# Altium footprint library Tomra_Cadstar_Footprints.PcbLib: 373 footprints (part 12 of 24)
Each footprint in its own frame and in the unit in brackets; x right, y up, seen from the top. Pads: shape width x height; smd on the part's side, far side on the other; paste and mask are expansions set on the pad; w line width, h text height; cw(c..) or ccw(c..) is an arc to the next point about the centre after c.
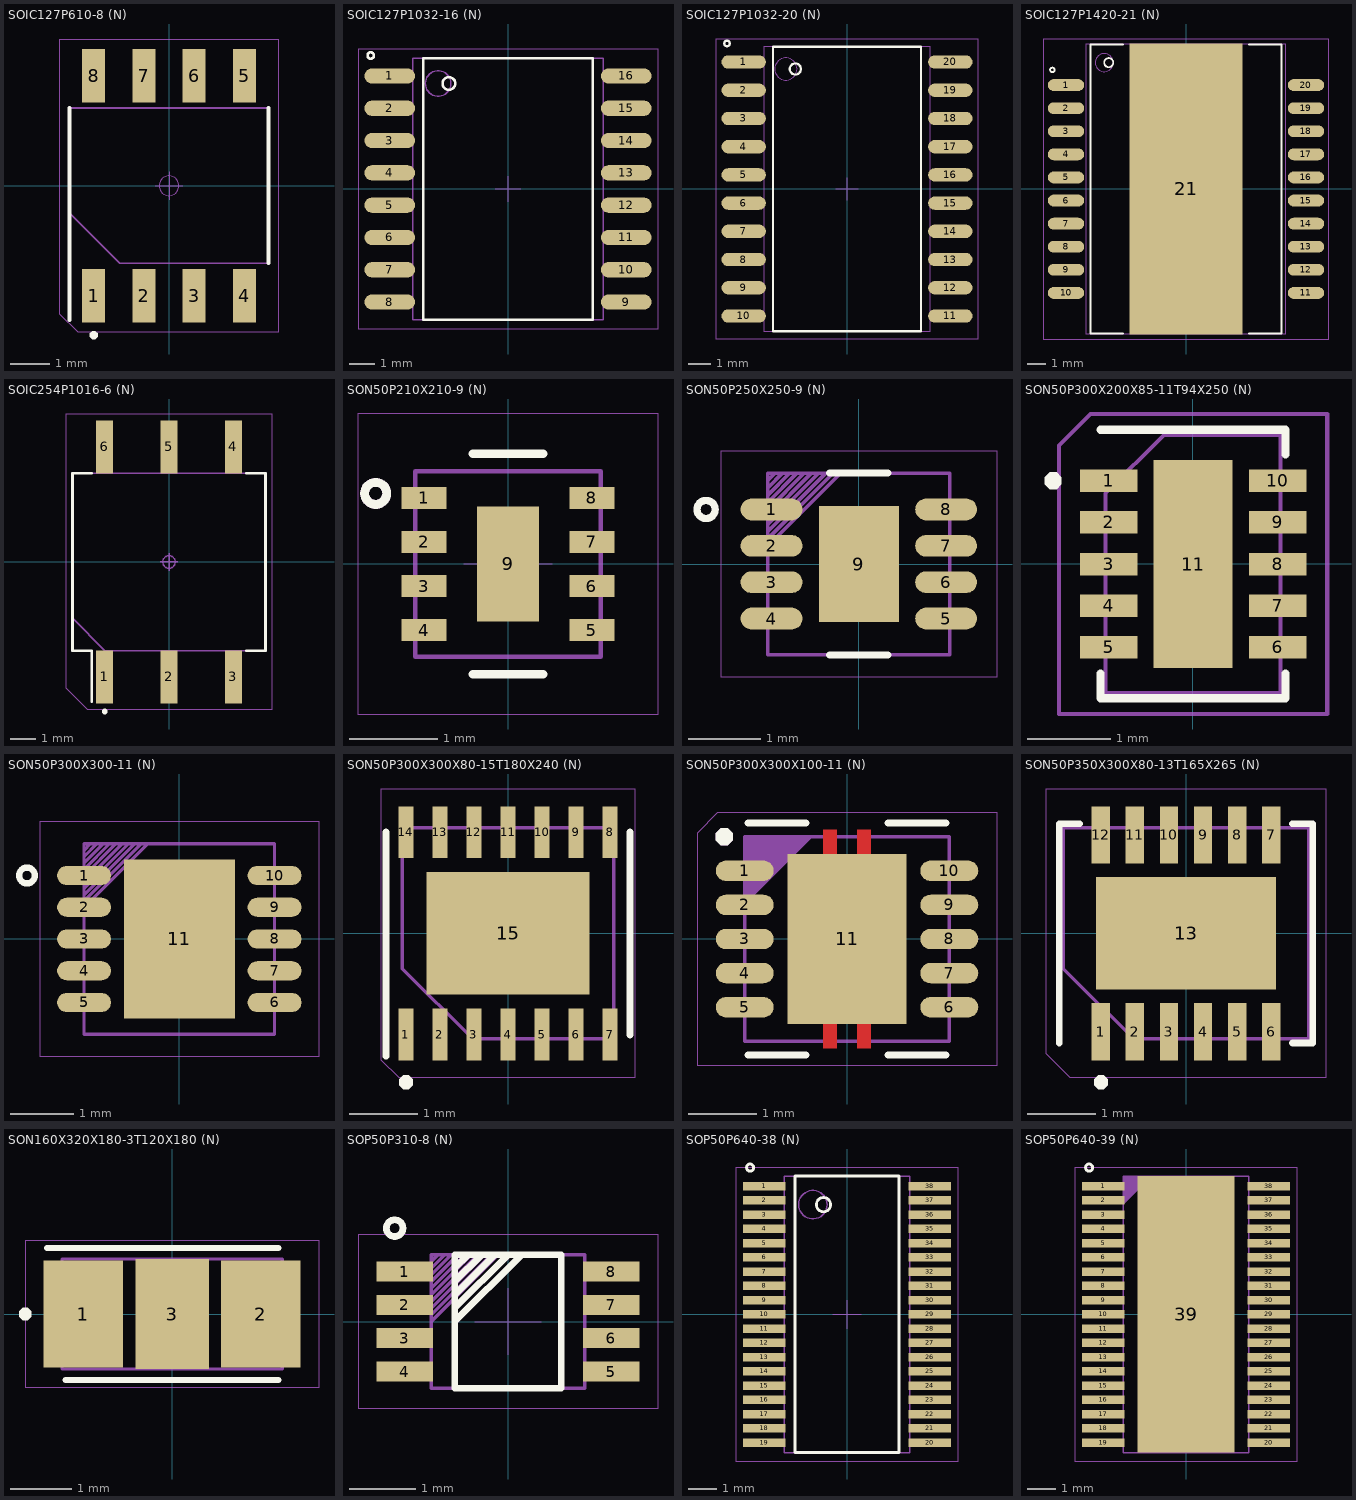
[diagram p11: the footprints below, top view; thin cyan lines are the x and y axes]

## SOIC127P610-8 (N) [mm]
height 3.51
pads (8):
  rect 0.58x1.35 smd paste+0 mask+0: 1(-1.905,-2.78) 2(-0.635,-2.78) 3(0.635,-2.78) 4(1.905,-2.78) 5(1.905,2.78) 6(0.635,2.78) 7(-0.635,2.78) 8(-1.905,2.78)
Top Silk:
  region: -2.005,-3.775 -2.005,-3.734 -1.946,-3.675 -1.864,-3.675 -1.805,-3.734 -1.805,-3.775 -1.805,-3.816 -1.864,-3.875 -1.946,-3.875 -2.005,-3.816
  lines w0.1: -2.51,-3.395 -2.51,1.96 ; 2.51,-1.96 2.51,1.96
  text ".Designator" at -3.599,-0.35 h0.7
Top Assembly:
  lines w0.05: -2.51,-0.69 -1.24,-1.96 2.51,-1.96 2.51,1.96 -2.51,1.96 -2.51,-0.69
Top Placement:
  lines w0.01: -0.35,0 0.35,0 ; 0,-0.35 0,0.35 ; -2.76,-3.25 -2.3,-3.71 2.76,-3.71 2.76,3.71 -2.76,3.71 -2.76,-3.25 ; -0.25,0 cw(c0,0) 0.25,0 cw(c0,0) -0.25,0

## SOIC127P1032-16 (N) [mm]
height 2.65
pads (16):
  oval 2x0.6 smd paste+0 mask+0: 1(-4.65,4.445) 2(-4.65,3.175) 3(-4.65,1.905) 4(-4.65,0.635) 5(-4.65,-0.635) 6(-4.65,-1.905) 7(-4.65,-3.175) 8(-4.65,-4.445) 9(4.65,-4.445) 10(4.65,-3.175) 11(4.65,-1.905) 12(4.65,-0.635) 13(4.65,0.635) 14(4.65,1.905) 15(4.65,3.175) 16(4.65,4.445)
Top Silk:
  lines w0.1: -5.525,5.25 cw(c-5.4,5.25) -5.275,5.25 cw(c-5.4,5.25) -5.525,5.25 ; -3.325,-5.15 3.325,-5.15 3.325,5.15 -3.325,5.15 -3.325,-5.15 ; -2.575,4.15 cw(c-2.325,4.15) -2.075,4.15 cw(c-2.325,4.15) -2.575,4.15
  text ".Designator" at -3.599,-0.35 h0.7
Top Assembly:
  lines w0.05: -3.75,-5.15 3.75,-5.15 3.75,5.15 -3.75,5.15 -3.75,-5.15 ; -3.25,4.15 cw(c-2.75,4.15) -2.25,4.15 cw(c-2.75,4.15) -3.25,4.15
Top Placement:
  lines w0.01: -0.5,0 0.5,0 ; 0,-0.5 0,0.5 ; -5.9,-5.5 5.9,-5.5 5.9,5.5 -5.9,5.5 -5.9,-5.5

## SOIC127P1032-20 (N) [mm]
height 2.65
pads (20):
  oval 2x0.6 smd paste+0 mask+0: 1(-4.65,5.715) 2(-4.65,4.445) 3(-4.65,3.175) 4(-4.65,1.905) 5(-4.65,0.635) 6(-4.65,-0.635) 7(-4.65,-1.905) 8(-4.65,-3.175) 9(-4.65,-4.445) 10(-4.65,-5.715) 11(4.65,-5.715) 12(4.65,-4.445) 13(4.65,-3.175) 14(4.65,-1.905) 15(4.65,-0.635) 16(4.65,0.635) 17(4.65,1.905) 18(4.65,3.175) 19(4.65,4.445) 20(4.65,5.715)
Top Silk:
  lines w0.1: -5.525,6.55 cw(c-5.4,6.55) -5.275,6.55 cw(c-5.4,6.55) -5.525,6.55 ; -3.325,-6.4 3.325,-6.4 3.325,6.4 -3.325,6.4 -3.325,-6.4 ; -2.575,5.4 cw(c-2.325,5.4) -2.075,5.4 cw(c-2.325,5.4) -2.575,5.4
  text ".Designator" at -3.599,-0.35 h0.7
Top Assembly:
  lines w0.05: -3.75,-6.4 3.75,-6.4 3.75,6.4 -3.75,6.4 -3.75,-6.4 ; -3.25,5.4 cw(c-2.75,5.4) -2.25,5.4 cw(c-2.75,5.4) -3.25,5.4
Top Placement:
  lines w0.01: -0.5,0 0.5,0 ; 0,-0.5 0,0.5 ; -5.9,-6.75 5.9,-6.75 5.9,6.75 -5.9,6.75 -5.9,-6.75

## SOIC127P1420-21 (N) [mm]
height 3.6
pads (21):
  oval 2x0.65 smd paste+0 mask+0: 1(-6.6,5.715) 2(-6.6,4.445) 3(-6.6,3.175) 4(-6.6,1.905) 5(-6.6,0.635) 6(-6.6,-0.635) 7(-6.6,-1.905) 8(-6.6,-3.175) 9(-6.6,-4.445) 10(-6.6,-5.715) 11(6.6,-5.715) 12(6.6,-4.445) 13(6.6,-3.175) 14(6.6,-1.905) 15(6.6,-0.635) 16(6.6,0.635) 17(6.6,1.905) 18(6.6,3.175) 19(6.6,4.445) 20(6.6,5.715)
  rect 6.2x16 smd paste+0 mask+0: 21(0,0)
Top Silk:
  lines w0.1: -3.45,-7.95 -5.25,-7.95 -5.25,7.95 -3.45,7.95 ; 3.45,-7.95 5.25,-7.95 5.25,7.95 3.45,7.95 ; -7.475,6.55 cw(c-7.35,6.55) -7.225,6.55 cw(c-7.35,6.55) -7.475,6.55 ; -4.5,6.95 cw(c-4.25,6.95) -4,6.95 cw(c-4.25,6.95) -4.5,6.95
  text ".Designator" at -3.599,-0.35 h0.7
Top Assembly:
  lines w0.05: -5.5,-7.95 5.5,-7.95 5.5,7.95 -5.5,7.95 -5.5,-7.95 ; -5,6.95 cw(c-4.5,6.95) -4,6.95 cw(c-4.5,6.95) -5,6.95
Top Placement:
  lines w0.01: -0.5,0 0.5,0 ; 0,-0.5 0,0.5 ; -7.85,-8.25 7.85,-8.25 7.85,8.25 -7.85,8.25 -7.85,-8.25

## SOIC254P1016-6 (N) [mm]
height 4.6
pads (6):
  rect 0.67x2.09 smd paste+0 mask+0: 1(-2.54,-4.54) 2(0,-4.54) 3(2.54,-4.54) 4(2.54,4.54) 5(0,4.54) 6(-2.54,4.54)
Top Silk:
  region: -2.64,-5.905 -2.64,-5.864 -2.581,-5.805 -2.499,-5.805 -2.44,-5.864 -2.44,-5.905 -2.44,-5.946 -2.499,-6.005 -2.581,-6.005 -2.64,-5.946
  lines w0.1: -3.055,-5.525 -3.055,-3.5 -3.81,-3.5 -3.81,3.5 -3.055,3.5 ; 3.055,-3.5 3.81,-3.5 3.81,3.5 3.055,3.5
  text ".Designator" at -3.599,-0.35 h0.7
Top Assembly:
  lines w0.05: -3.81,-2.23 -2.54,-3.5 3.81,-3.5 3.81,3.5 -3.81,3.5 -3.81,-2.23
Top Placement:
  lines w0.01: -4.06,-4.98 -3.2,-5.84 4.06,-5.84 4.06,5.84 -4.06,5.84 -4.06,-4.98
  lines w0.05: -0.35,0 0.35,0 ; 0,-0.35 0,0.35 ; -0.25,0 cw(c0,0) 0.25,0 cw(c0,0) -0.25,0

## SON50P210X210-9 (N) [mm]
height 0.8
pads (9):
  rect 0.51x0.25 smd paste+0 mask+0: 1(-0.95,0.75) 2(-0.95,0.25) 3(-0.95,-0.25) 4(-0.95,-0.75) 5(0.95,-0.75) 6(0.95,-0.25) 7(0.95,0.25) 8(0.95,0.75)
  rect 0.7x1.3 smd paste+0 mask+0: 9(0,0)
Top Silk:
  lines w0.1: -0.4,-1.25 0.4,-1.25 ; -0.4,1.25 0.4,1.25 ; -1.625,0.8 cw(c-1.5,0.8) -1.375,0.8 cw(c-1.5,0.8) -1.625,0.8
  text ".Designator" at -3.599,-0.35 h0.7
Top Assembly:
  lines w0.05: -1.05,-1.05 -1.05,1.05 1.05,1.05 1.05,-1.05 -1.05,-1.05
  lines w0.1: -1.625,0.8 cw(c-1.5,0.8) -1.375,0.8 cw(c-1.5,0.8) -1.625,0.8
Top Placement:
  lines w0.01: -0.5,0 0.5,0 ; 0,-0.5 0,0.5 ; -1.7,-1.7 1.7,-1.7 1.7,1.7 -1.7,1.7 -1.7,-1.7

## SON50P250X250-9 (N) [mm]
height 0.8
pads (9):
  oval 0.85x0.3 smd paste+0 mask+0: 1(-1.2,0.75) 2(-1.2,0.25) 3(-1.2,-0.25) 4(-1.2,-0.75) 5(1.2,-0.75) 6(1.2,-0.25) 7(1.2,0.25) 8(1.2,0.75)
  rect 1.1x1.6 smd paste+0 mask+0: 9(0,0)
Top Silk:
  lines w0.1: -0.4,-1.25 0.4,-1.25 ; -0.4,1.25 0.4,1.25 ; -2.225,0.75 cw(c-2.1,0.75) -1.975,0.75 cw(c-2.1,0.75) -2.225,0.75
  text ".Designator" at -3.599,-0.35 h0.7
Top Assembly:
  lines w0.05: -1.25,0.25 -0.25,1.25 ; -1.25,0.35 -0.35,1.25 ; -1.25,0.45 -0.45,1.25 ; -1.25,0.55 -0.55,1.25 ; -1.25,0.65 -0.65,1.25 ; -1.25,0.75 -0.75,1.25 ; -1.25,0.85 -0.85,1.25 ; -1.25,0.95 -0.95,1.25 ; -1.25,1.05 -1.05,1.25 ; -1.25,1.15 -1.15,1.25 ; -1.25,-1.25 -1.25,1.25 1.25,1.25 1.25,-1.25 -1.25,-1.25
Top Placement:
  lines w0.01: -0.5,0 0.5,0 ; 0,-0.5 0,0.5 ; -1.9,-1.55 1.9,-1.55 1.9,1.55 -1.9,1.55 -1.9,-1.55

## SON50P300X200X85-11T94X250 (N) [mm]
height 0.85
pads (11):
  rect 0.69x0.27 smd paste+0 mask+0: 1(-1.012,0.997) 2(-1.012,0.497) 3(-1.012,-0.003) 4(-1.012,-0.503) 5(-1.012,-1.002) 6(1.017,-1.002) 7(1.017,-0.503) 8(1.017,-0.003) 9(1.017,0.497) 10(1.017,0.997)
  rect 0.95x2.5 smd paste+0 mask+0: 11(0.002,-0.003)
Top Silk:
  region: -1.677,1.097 -1.636,1.097 -1.578,1.039 -1.578,0.956 -1.636,0.897 -1.677,0.897 -1.719,0.897 -1.777,0.956 -1.777,1.039 -1.719,1.097
  lines w0.1: -1.108,-1.318 -1.108,-1.613 1.112,-1.613 1.112,-1.318 ; -1.108,1.607 1.112,1.607 1.112,1.312
  text ".Designator" at -1.108,1.607 h0.7
Top Assembly:
  lines w0.05: -1.048,-1.553 -1.048,0.847 -0.347,1.548 1.052,1.548 1.052,-1.553 -1.048,-1.553
Top Placement:
  lines w0.05: -0.347,-0.003 0.352,-0.003 ; 0.002,-0.353 0.002,0.347 ; -1.607,-1.803 1.612,-1.803 1.612,1.797 -1.23,1.797 -1.607,1.42 -1.607,-1.803 ; 0.002,-0.253 ccw(c0.002,-0.003) 0.002,0.247 ccw(c0.002,-0.003) 0.002,-0.253

## SON50P300X300-11 (N) [mm]
height 1
pads (11):
  oval 0.85x0.3 smd paste+0 mask+0: 1(-1.5,1) 2(-1.5,0.5) 3(-1.5,0) 4(-1.5,-0.5) 5(-1.5,-1) 6(1.5,-1) 7(1.5,-0.5) 8(1.5,0) 9(1.5,0.5) 10(1.5,1)
  rect 1.75x2.5 smd paste+0 mask+0: 11(0,0)
Top Silk:
  lines w0.1: -2.525,1 cw(c-2.4,1) -2.275,1 cw(c-2.4,1) -2.525,1
  text ".Designator" at -3.599,-0.35 h0.7
Top Assembly:
  lines w0.05: -1.5,0.5 -0.5,1.5 ; -1.5,0.6 -0.6,1.5 ; -1.5,0.7 -0.7,1.5 ; -1.5,0.8 -0.8,1.5 ; -1.5,0.9 -0.9,1.5 ; -1.5,1 -1,1.5 ; -1.5,1.1 -1.1,1.5 ; -1.5,1.2 -1.2,1.5 ; -1.5,1.3 -1.3,1.5 ; -1.5,1.4 -1.4,1.5 ; -1.5,-1.5 -1.5,1.5 1.5,1.5 1.5,-1.5 -1.5,-1.5
Top Placement:
  lines w0.01: -0.5,0 0.5,0 ; 0,-0.5 0,0.5 ; -2.2,-1.85 2.2,-1.85 2.2,1.85 -2.2,1.85 -2.2,-1.85

## SON50P300X300X80-15T180X240 (N) [mm]
height 0.8
pads (15):
  rect 0.22x0.76 smd paste+0 mask+0: 1(-1.5,-1.485) 2(-1,-1.485) 3(-0.5,-1.485) 4(0,-1.485) 5(0.5,-1.485) 6(1,-1.485) 7(1.5,-1.485) 8(1.5,1.485) 9(1,1.485) 10(0.5,1.485) 11(0,1.485) 12(-0.5,1.485) 13(-1,1.485) 14(-1.5,1.485)
  rect 2.4x1.8 smd paste+0 mask+0: 15(0,0)
Top Silk:
  region: -1.6,-2.185 -1.6,-2.144 -1.541,-2.085 -1.459,-2.085 -1.4,-2.144 -1.4,-2.185 -1.4,-2.226 -1.459,-2.285 -1.541,-2.285 -1.6,-2.226
  lines w0.1: -1.79,-1.805 -1.79,1.49 ; 1.79,-1.49 1.79,1.49
  text ".Designator" at -1.86,2.12 h0.7
Top Assembly:
  lines w0.05: -1.55,-0.517 -0.517,-1.55 1.55,-1.55 1.55,1.55 -1.55,1.55 -1.55,-0.517
Top Placement:
  lines w0.01: -1.86,-1.86 -1.6,-2.12 1.86,-2.12 1.86,2.12 -1.86,2.12 -1.86,-1.86
  lines w0.05: -0.35,0 0.35,0 ; 0,-0.35 0,0.35 ; -0.25,0 cw(c0,0) 0.25,0 cw(c0,0) -0.25,0

## SON50P300X300X100-11 (N) [mm]
height 1
pads (11):
  oval 0.85x0.3 smd paste+0 mask+0: 1(-1.5,1) 2(-1.5,0.5) 3(-1.5,0) 4(-1.5,-0.5) 5(-1.5,-1) 6(1.5,-1) 7(1.5,-0.5) 8(1.5,0) 9(1.5,0.5) 10(1.5,1)
  rect 1.75x2.5 smd paste-0.75 mask+0: 11(0,0)
Top Elec:
  region: -0.8,-1.15 -0.35,-1.15 -0.35,-1.6 -0.15,-1.6 -0.15,-1.15 0.15,-1.15 0.15,-1.6 0.35,-1.6 0.35,-1.15 0.8,-1.15 0.8,1.15 0.35,1.15 0.35,1.6 0.15,1.6 0.15,1.15 -0.15,1.15 -0.15,1.6 -0.35,1.6 -0.35,1.15 -0.8,1.15
Top Silk:
  region: -1.925,1.5 -1.925,1.552 -1.852,1.625 -1.748,1.625 -1.675,1.552 -1.675,1.5 -1.675,1.448 -1.748,1.375 -1.852,1.375 -1.925,1.448
  lines w0.1: -1.45,-1.7 -0.6,-1.7 ; -1.45,1.7 -0.6,1.7 ; 0.6,-1.7 1.45,-1.7 ; 0.6,1.7 1.45,1.7
  text ".Designator" at -3.599,-0.35 h0.7
Top Solder Resist:
  region: -0.8,-1.15 -0.35,-1.15 -0.35,-1.6 -0.15,-1.6 -0.15,-1.15 0.15,-1.15 0.15,-1.6 0.35,-1.6 0.35,-1.15 0.8,-1.15 0.8,1.15 0.35,1.15 0.35,1.6 0.15,1.6 0.15,1.15 -0.15,1.15 -0.15,1.6 -0.35,1.6 -0.35,1.15 -0.8,1.15
Top Assembly:
  region: -1.5,1.5 -0.5,1.5 -1.5,0.5
  region: -1.925,1.5 -1.925,1.552 -1.852,1.625 -1.748,1.625 -1.675,1.552 -1.675,1.5 -1.675,1.448 -1.748,1.375 -1.852,1.375 -1.925,1.448
  lines w0.05: -1.5,-1.5 -1.5,1.5 1.5,1.5 1.5,-1.5 -1.5,-1.5
Top Placement:
  lines w0.01: -0.5,0 0.5,0 ; 0,-0.5 0,0.5 ; -2.2,-1.85 2.2,-1.85 2.2,1.85 -1.9,1.85 -2.2,1.55 -2.2,-1.85

## SON50P350X300X80-13T165X265 (N) [mm]
height 0.8
pads (13):
  rect 0.27x0.84 smd paste+0 mask+0: 1(-1.25,-1.445) 2(-0.75,-1.445) 3(-0.25,-1.445) 4(0.25,-1.445) 5(0.75,-1.445) 6(1.25,-1.445) 7(1.25,1.445) 8(0.75,1.445) 9(0.25,1.445) 10(-0.25,1.445) 11(-0.75,1.445) 12(-1.25,1.445)
  rect 2.65x1.65 smd paste+0 mask+0: 13(0,0)
Top Silk:
  region: -1.35,-2.185 -1.35,-2.144 -1.291,-2.085 -1.209,-2.085 -1.15,-2.144 -1.15,-2.185 -1.15,-2.226 -1.209,-2.285 -1.291,-2.285 -1.35,-2.226
  lines w0.1: -1.86,-1.61 -1.86,1.61 -1.565,1.61 ; 1.565,-1.61 1.86,-1.61 1.86,1.61 1.565,1.61
  text ".Designator" at -2.05,2.12 h0.7
Top Paste:
  region: 1.13,-0.63 0.1,-0.63 0.1,-0.1 1.13,-0.1
  region: 1.13,0.1 0.1,0.1 0.1,0.63 1.13,0.63
  region: -0.1,-0.63 -1.13,-0.63 -1.13,-0.1 -0.1,-0.1
  region: -0.1,0.1 -1.13,0.1 -1.13,0.63 -0.1,0.63
Top Assembly:
  lines w0.05: -1.8,-0.517 -0.767,-1.55 1.8,-1.55 1.8,1.55 -1.8,1.55 -1.8,-0.517
Top Placement:
  lines w0.01: -2.05,-1.77 -1.7,-2.12 2.05,-2.12 2.05,2.12 -2.05,2.12 -2.05,-1.77
  lines w0.05: -0.35,0 0.35,0 ; 0,-0.35 0,0.35 ; -0.25,0 cw(c0,0) 0.25,0 cw(c0,0) -0.25,0

## SON160X320X180-3T120X180 (N) [mm]
height 1.8
pads (3):
  rrect0% 1.3x1.74 smd paste+0 mask+0: 1(-1.45,0) 2(1.45,0)
  rect 1.2x1.8 smd paste+0 mask+0: 3(0,0)
Top Silk:
  region: -2.4,0.1 -2.359,0.1 -2.3,0.041 -2.3,-0.041 -2.359,-0.1 -2.4,-0.1 -2.441,-0.1 -2.5,-0.041 -2.5,0.041 -2.441,0.1
  lines w0.1: -2.04,1.08 1.74,1.08 ; -1.74,-1.08 1.74,-1.08
  text ".Designator" at -3.599,-0.35 h0.7
Top Paste:
  region: -0.39,-0.76 -0.39,-0.07 0.39,-0.07 0.39,-0.76
  region: -0.39,0.07 -0.39,0.76 0.39,0.76 0.39,0.07
Top Assembly:
  lines w0.05: -1.8,-0.9 -1.8,0.9 1.8,0.9 1.8,-0.9 -1.8,-0.9
Top Placement:
  lines w0.01: -2.4,-1.2 -2.4,1.2 2.4,1.2 2.4,-1.2 -2.4,-1.2
  lines w0.05: 0,-0.25 ccw(c0,0) 0,0.25 ; 0,-0.25 cw(c0,0) 0,0.25 ; 0,-0.25 ccw(c0,0) 0,0.25 ; 0,-0.25 cw(c0,0) 0,0.25 ; -0.35,0 0.35,0 -0.35,0 ; 0,-0.35 0,0.35 0,-0.35

## SOP50P310-8 (N) [mm]
height 0.9
pads (8):
  rect 0.85x0.3 smd paste+0 mask+0: 1(-1.55,0.75) 2(-1.55,0.25) 3(-1.55,-0.25) 4(-1.55,-0.75) 5(1.55,-0.75) 6(1.55,-0.25) 7(1.55,0.25) 8(1.55,0.75)
Top Silk:
  lines w0.1: -0.8,0 0.2,1 ; -0.8,0.2 0,1 ; -0.8,0.4 -0.2,1 ; -0.8,0.6 -0.4,1 ; -0.8,0.8 -0.6,1 ; -1.825,1.4 cw(c-1.7,1.4) -1.575,1.4 cw(c-1.7,1.4) -1.825,1.4 ; -0.8,-1 0.8,-1 0.8,1 -0.8,1 -0.8,-1
  text ".Designator" at -3.599,-0.35 h0.7
Top Assembly:
  lines w0.05: -1.15,0 -0.15,1 ; -1.15,0.1 -0.25,1 ; -1.15,0.2 -0.35,1 ; -1.15,0.3 -0.45,1 ; -1.15,0.4 -0.55,1 ; -1.15,0.5 -0.65,1 ; -1.15,0.6 -0.75,1 ; -1.15,0.7 -0.85,1 ; -1.15,0.8 -0.95,1 ; -1.15,0.9 -1.05,1 ; -1.15,-1 1.15,-1 1.15,1 -1.15,1 -1.15,-1
Top Placement:
  lines w0.01: -0.5,0 0.5,0 ; 0,-0.5 0,0.5 ; -2.25,-1.3 2.25,-1.3 2.25,1.3 -2.25,1.3 -2.25,-1.3

## SOP50P640-38 (N) [mm]
height 1.2
pads (38):
  rect 1.5x0.3 smd paste+0 mask+0: 1(-2.9,4.5) 2(-2.9,4) 3(-2.9,3.5) 4(-2.9,3) 5(-2.9,2.5) 6(-2.9,2) 7(-2.9,1.5) 8(-2.9,1) 9(-2.9,0.5) 10(-2.9,0) 11(-2.9,-0.5) 12(-2.9,-1) 13(-2.9,-1.5) 14(-2.9,-2) 15(-2.9,-2.5) 16(-2.9,-3) 17(-2.9,-3.5) 18(-2.9,-4) 19(-2.9,-4.5) 20(2.9,-4.5) 21(2.9,-4) 22(2.9,-3.5) 23(2.9,-3) 24(2.9,-2.5) 25(2.9,-2) 26(2.9,-1.5) 27(2.9,-1) 28(2.9,-0.5) 29(2.9,0) 30(2.9,0.5) 31(2.9,1) 32(2.9,1.5) 33(2.9,2) 34(2.9,2.5) 35(2.9,3) 36(2.9,3.5) 37(2.9,4) 38(2.9,4.5)
Top Silk:
  lines w0.1: -3.525,5.15 cw(c-3.4,5.15) -3.275,5.15 cw(c-3.4,5.15) -3.525,5.15 ; -1.825,-4.85 1.825,-4.85 1.825,4.85 -1.825,4.85 -1.825,-4.85 ; -1.075,3.85 cw(c-0.825,3.85) -0.575,3.85 cw(c-0.825,3.85) -1.075,3.85
  text ".Designator" at -3.599,-0.35 h0.7
Top Assembly:
  lines w0.05: -2.2,-4.85 2.2,-4.85 2.2,4.85 -2.2,4.85 -2.2,-4.85 ; -1.7,3.85 cw(c-1.2,3.85) -0.7,3.85 cw(c-1.2,3.85) -1.7,3.85
Top Placement:
  lines w0.01: -0.5,0 0.5,0 ; 0,-0.5 0,0.5 ; -3.9,-5.15 3.9,-5.15 3.9,5.15 -3.9,5.15 -3.9,-5.15

## SOP50P640-39 (N) [mm]
height 1.2
pads (39):
  rect 1.5x0.3 smd paste+0 mask+0: 1(-2.9,4.5) 2(-2.9,4) 3(-2.9,3.5) 4(-2.9,3) 5(-2.9,2.5) 6(-2.9,2) 7(-2.9,1.5) 8(-2.9,1) 9(-2.9,0.5) 10(-2.9,0) 11(-2.9,-0.5) 12(-2.9,-1) 13(-2.9,-1.5) 14(-2.9,-2) 15(-2.9,-2.5) 16(-2.9,-3) 17(-2.9,-3.5) 18(-2.9,-4) 19(-2.9,-4.5) 20(2.9,-4.5) 21(2.9,-4) 22(2.9,-3.5) 23(2.9,-3) 24(2.9,-2.5) 25(2.9,-2) 26(2.9,-1.5) 27(2.9,-1) 28(2.9,-0.5) 29(2.9,0) 30(2.9,0.5) 31(2.9,1) 32(2.9,1.5) 33(2.9,2) 34(2.9,2.5) 35(2.9,3) 36(2.9,3.5) 37(2.9,4) 38(2.9,4.5)
  rect 3.4x9.7 smd paste+0 mask+0: 39(0,0)
Top Silk:
  lines w0.1: -3.525,5.15 cw(c-3.4,5.15) -3.275,5.15 cw(c-3.4,5.15) -3.525,5.15
  text ".Designator" at -3.9,5.15 h0.7
Top Assembly:
  region: -2.2,4.85 -2.2,3.85 -1.2,4.85 -1.575,4.85
  lines w0.05: -2.2,-4.85 2.2,-4.85 2.2,4.85 -2.2,4.85 -2.2,-4.85
Top Placement:
  lines w0.01: -0.5,0 0.5,0 ; 0,-0.5 0,0.5 ; -3.9,-5.15 3.9,-5.15 3.9,5.15 -3.9,5.15 -3.9,-5.15